# Altium footprint library con-samtec.PCBLIB: 805 footprints (part 24 of 55)
Each footprint in its own frame and in the unit in brackets; x right, y up, seen from the top. Pads: shape width x height; smd on the part's side, far side on the other; paste and mask are expansions set on the pad; w line width, h text height; cw(c..) or ccw(c..) is an arc to the next point about the centre after c.
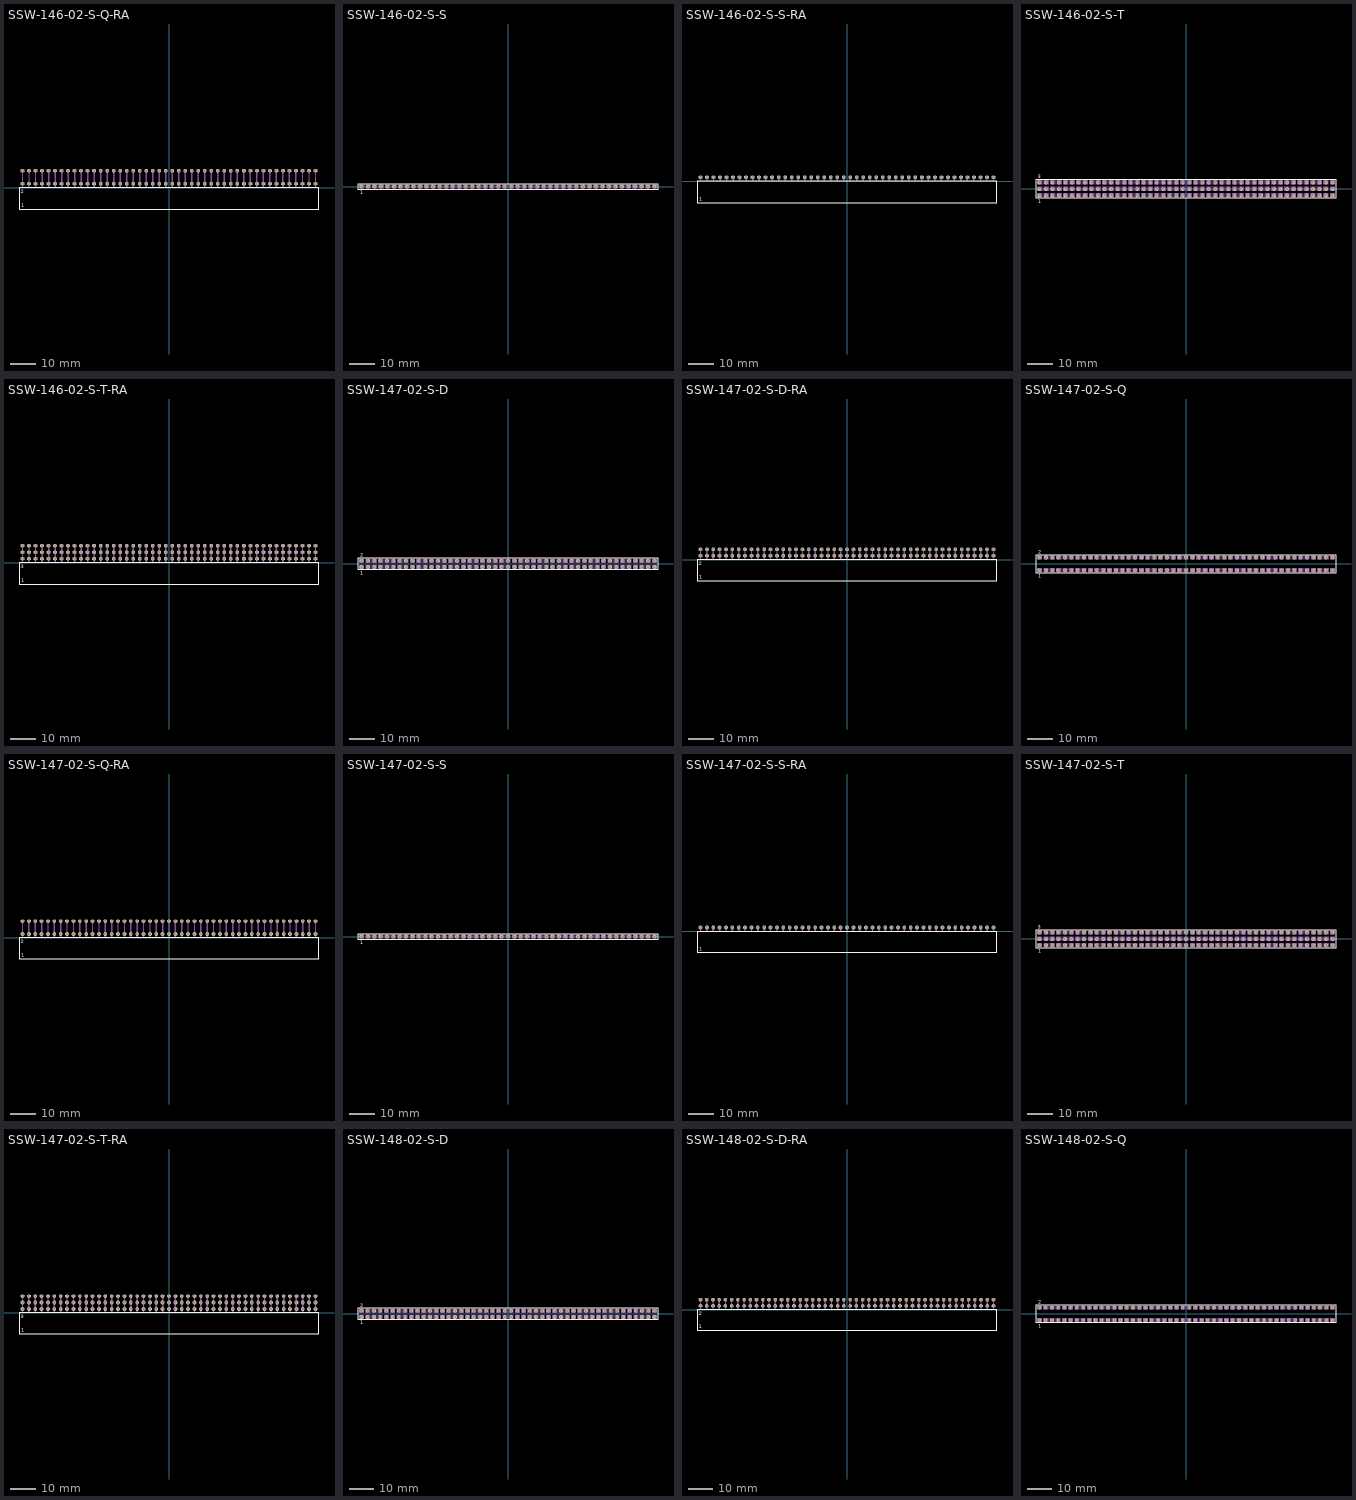
[diagram p23: the footprints below, top view; thin cyan lines are the x and y axes]

## SSW-146-02-S-Q-RA [mil]
pads (92):
  oct 59.06x59.06 hole 39.37: 1(-2250,60) 2(-2250,260) 3(-2150,60) 4(-2150,260) 5(-2050,60) 6(-2050,260) 7(-1950,60) 8(-1950,260) 9(-1850,60) 10(-1850,260) 11(-1750,60) 12(-1750,260) 13(-1650,60) 14(-1650,260) 15(-1550,60) 16(-1550,260) 17(-1450,60) 18(-1450,260) 19(-1350,60) 20(-1350,260) 21(-1250,60) 22(-1250,260) 23(-1150,60) 24(-1150,260) 25(-1050,60) 26(-1050,260) 27(-950,60) 28(-950,260) 29(-850,60) 30(-850,260) 31(-750,60) 32(-750,260) 33(-650,60) 34(-650,260) 35(-550,60) 36(-550,260) 37(-450,60) 38(-450,260) 39(-350,60) 40(-350,260) 41(-250,60) 42(-250,260) 43(-150,60) 44(-150,260) 45(-50,60) 46(-50,260) 47(50,60) 48(50,260) 49(150,60) 50(150,260) 51(250,60) 52(250,260) 53(350,60) 54(350,260) 55(450,60) 56(450,260) 57(550,60) 58(550,260) 59(650,60) 60(650,260) 61(750,60) 62(750,260) 63(850,60) 64(850,260) 65(950,60) 66(950,260) 67(1050,60) 68(1050,260) 69(1150,60) 70(1150,260) 71(1250,60) 72(1250,260) 73(1350,60) 74(1350,260) 75(1450,60) 76(1450,260) 77(1550,60) 78(1550,260) 79(1650,60) 80(1650,260) 81(1750,60) 82(1750,260) 83(1850,60) 84(1850,260) 85(1950,60) 86(1950,260) 87(2050,60) 88(2050,260) 89(2150,60) 90(2150,260) 91(2250,60) 92(2250,260)
Top Overlay:
  lines w8: -2305.08,-330.55 2305.08,-330.55 2305.08,-4.17 -2305.08,-4.17 -2305.08,-330.55
  text "1" at -2273.43,-301.18 h56.1
  text "2" at -2276.38,-86.61 h56.1
Mechanical 16:
  rectangle: -2260,0 -2240,270
  rectangle: -2160,0 -2140,270
  rectangle: -2060,0 -2040,270
  rectangle: -1960,0 -1940,270
  rectangle: -1860,0 -1840,270
  rectangle: -1760,0 -1740,270
  rectangle: -1660,0 -1640,270
  rectangle: -1560,0 -1540,270
  rectangle: -1460,0 -1440,270
  rectangle: -1360,0 -1340,270
  rectangle: -1260,0 -1240,270
  rectangle: -1160,0 -1140,270
  rectangle: -1060,0 -1040,270
  rectangle: -960,0 -940,270
  rectangle: -860,0 -840,270
  rectangle: -760,0 -740,270
  rectangle: -660,0 -640,270
  rectangle: -560,0 -540,270
  rectangle: -460,0 -440,270
  rectangle: -360,0 -340,270
  rectangle: -260,0 -240,270
  rectangle: -160,0 -140,270
  rectangle: -60,0 -40,270
  rectangle: 40,0 60,270
  rectangle: 140,0 160,270
  rectangle: 240,0 260,270
  rectangle: 340,0 360,270
  rectangle: 440,0 460,270
  rectangle: 540,0 560,270
  rectangle: 640,0 660,270
  rectangle: 740,0 760,270
  rectangle: 840,0 860,270
  rectangle: 940,0 960,270
  rectangle: 1040,0 1060,270
  rectangle: 1140,0 1160,270
  rectangle: 1240,0 1260,270
  rectangle: 1340,0 1360,270
  rectangle: 1440,0 1460,270
  rectangle: 1540,0 1560,270
  rectangle: 1640,0 1660,270
  rectangle: 1740,0 1760,270
  rectangle: 1840,0 1860,270
  rectangle: 1940,0 1960,270
  rectangle: 2040,0 2060,270
  rectangle: 2140,0 2160,270
  rectangle: 2240,0 2260,270

## SSW-146-02-S-S [mm]
pads (46):
  oct 1.5x1.5 hole 1: 1(-57.15,0) 2(-54.61,0) 3(-52.07,0) 4(-49.53,0) 5(-46.99,0) 6(-44.45,0) 7(-41.91,0) 8(-39.37,0) 9(-36.83,0) 10(-34.29,0) 11(-31.75,0) 12(-29.21,0) 13(-26.67,0) 14(-24.13,0) 15(-21.59,0) 16(-19.05,0) 17(-16.51,0) 18(-13.97,0) 19(-11.43,0) 20(-8.89,0) 21(-6.35,0) 22(-3.81,0) 23(-1.27,0) 24(1.27,0) 25(3.81,0) 26(6.35,0) 27(8.89,0) 28(11.43,0) 29(13.97,0) 30(16.51,0) 31(19.05,0) 32(21.59,0) 33(24.13,0) 34(26.67,0) 35(29.21,0) 36(31.75,0) 37(34.29,0) 38(36.83,0) 39(39.37,0) 40(41.91,0) 41(44.45,0) 42(46.99,0) 43(49.53,0) 44(52.07,0) 45(54.61,0) 46(57.15,0)
Top Overlay:
  lines w0.203: -58.549,-1.155 58.549,-1.155 58.549,1.155 -58.549,1.155 -58.549,-1.155
  text "1" at -57.658,-3.048 h1.42
Mechanical 16:
  drawing of 184 lines, arcs and shapes, not listed

## SSW-146-02-S-S-RA [mil]
pads (46):
  oct 59.06x59.06 hole 39.37: 1(-2250,60) 2(-2150,60) 3(-2050,60) 4(-1950,60) 5(-1850,60) 6(-1750,60) 7(-1650,60) 8(-1550,60) 9(-1450,60) 10(-1350,60) 11(-1250,60) 12(-1150,60) 13(-1050,60) 14(-950,60) 15(-850,60) 16(-750,60) 17(-650,60) 18(-550,60) 19(-450,60) 20(-350,60) 21(-250,60) 22(-150,60) 23(-50,60) 24(50,60) 25(150,60) 26(250,60) 27(350,60) 28(450,60) 29(550,60) 30(650,60) 31(750,60) 32(850,60) 33(950,60) 34(1050,60) 35(1150,60) 36(1250,60) 37(1350,60) 38(1450,60) 39(1550,60) 40(1650,60) 41(1750,60) 42(1850,60) 43(1950,60) 44(2050,60) 45(2150,60) 46(2250,60)
Top Overlay:
  lines w8: -2305.08,-330.55 2305.08,-330.55 2305.08,-4.17 -2305.08,-4.17 -2305.08,-330.55
  text "1" at -2273.43,-301.18 h56.1
Mechanical 16:
  rectangle: -2260,0 -2240,70
  rectangle: -2160,0 -2140,70
  rectangle: -2060,0 -2040,70
  rectangle: -1960,0 -1940,70
  rectangle: -1860,0 -1840,70
  rectangle: -1760,0 -1740,70
  rectangle: -1660,0 -1640,70
  rectangle: -1560,0 -1540,70
  rectangle: -1460,0 -1440,70
  rectangle: -1360,0 -1340,70
  rectangle: -1260,0 -1240,70
  rectangle: -1160,0 -1140,70
  rectangle: -1060,0 -1040,70
  rectangle: -960,0 -940,70
  rectangle: -860,0 -840,70
  rectangle: -760,0 -740,70
  rectangle: -660,0 -640,70
  rectangle: -560,0 -540,70
  rectangle: -460,0 -440,70
  rectangle: -360,0 -340,70
  rectangle: -260,0 -240,70
  rectangle: -160,0 -140,70
  rectangle: -60,0 -40,70
  rectangle: 40,0 60,70
  rectangle: 140,0 160,70
  rectangle: 240,0 260,70
  rectangle: 340,0 360,70
  rectangle: 440,0 460,70
  rectangle: 540,0 560,70
  rectangle: 640,0 660,70
  rectangle: 740,0 760,70
  rectangle: 840,0 860,70
  rectangle: 940,0 960,70
  rectangle: 1040,0 1060,70
  rectangle: 1140,0 1160,70
  rectangle: 1240,0 1260,70
  rectangle: 1340,0 1360,70
  rectangle: 1440,0 1460,70
  rectangle: 1540,0 1560,70
  rectangle: 1640,0 1660,70
  rectangle: 1740,0 1760,70
  rectangle: 1840,0 1860,70
  rectangle: 1940,0 1960,70
  rectangle: 2040,0 2060,70
  rectangle: 2140,0 2160,70
  rectangle: 2240,0 2260,70

## SSW-146-02-S-T [mm]
pads (138):
  oct 1.5x1.5 hole 1: 1(-57.15,-2.54) 2(-57.15,0) 3(-57.15,2.54) 4(-54.61,-2.54) 5(-54.61,0) 6(-54.61,2.54) 7(-52.07,-2.54) 8(-52.07,0) 9(-52.07,2.54) 10(-49.53,-2.54) 11(-49.53,0) 12(-49.53,2.54) 13(-46.99,-2.54) 14(-46.99,0) 15(-46.99,2.54) 16(-44.45,-2.54) 17(-44.45,0) 18(-44.45,2.54) 19(-41.91,-2.54) 20(-41.91,0) 21(-41.91,2.54) 22(-39.37,-2.54) 23(-39.37,0) 24(-39.37,2.54) 25(-36.83,-2.54) 26(-36.83,0) 27(-36.83,2.54) 28(-34.29,-2.54) 29(-34.29,0) 30(-34.29,2.54) 31(-31.75,-2.54) 32(-31.75,0) 33(-31.75,2.54) 34(-29.21,-2.54) 35(-29.21,0) 36(-29.21,2.54) 37(-26.67,-2.54) 38(-26.67,0) 39(-26.67,2.54) 40(-24.13,-2.54) 41(-24.13,0) 42(-24.13,2.54) 43(-21.59,-2.54) 44(-21.59,0) 45(-21.59,2.54) 46(-19.05,-2.54) 47(-19.05,0) 48(-19.05,2.54) 49(-16.51,-2.54) 50(-16.51,0) 51(-16.51,2.54) 52(-13.97,-2.54) 53(-13.97,0) 54(-13.97,2.54) 55(-11.43,-2.54) 56(-11.43,0) 57(-11.43,2.54) 58(-8.89,-2.54) 59(-8.89,0) 60(-8.89,2.54) 61(-6.35,-2.54) 62(-6.35,0) 63(-6.35,2.54) 64(-3.81,-2.54) 65(-3.81,0) 66(-3.81,2.54) 67(-1.27,-2.54) 68(-1.27,0) 69(-1.27,2.54) 70(1.27,-2.54) 71(1.27,0) 72(1.27,2.54) 73(3.81,-2.54) 74(3.81,0) 75(3.81,2.54) 76(6.35,-2.54) 77(6.35,0) 78(6.35,2.54) 79(8.89,-2.54) 80(8.89,0) 81(8.89,2.54) 82(11.43,-2.54) 83(11.43,0) 84(11.43,2.54) 85(13.97,-2.54) 86(13.97,0) 87(13.97,2.54) 88(16.51,-2.54) 89(16.51,0) 90(16.51,2.54) 91(19.05,-2.54) 92(19.05,0) 93(19.05,2.54) 94(21.59,-2.54) 95(21.59,0) 96(21.59,2.54) 97(24.13,-2.54) 98(24.13,0) 99(24.13,2.54) 100(26.67,-2.54) 101(26.67,0) 102(26.67,2.54) 103(29.21,-2.54) 104(29.21,0) 105(29.21,2.54) 106(31.75,-2.54) 107(31.75,0) 108(31.75,2.54) 109(34.29,-2.54) 110(34.29,0) 111(34.29,2.54) 112(36.83,-2.54) 113(36.83,0) 114(36.83,2.54) 115(39.37,-2.54) 116(39.37,0) 117(39.37,2.54) 118(41.91,-2.54) 119(41.91,0) 120(41.91,2.54) 121(44.45,-2.54) 122(44.45,0) 123(44.45,2.54) 124(46.99,-2.54) 125(46.99,0) 126(46.99,2.54) 127(49.53,-2.54) 128(49.53,0) 129(49.53,2.54) 130(52.07,-2.54) 131(52.07,0) 132(52.07,2.54) 133(54.61,-2.54) 134(54.61,0) 135(54.61,2.54) 136(57.15,-2.54) 137(57.15,0) 138(57.15,2.54)
Top Overlay:
  lines w0.203: -58.549,-3.695 58.549,-3.695 58.549,3.695 -58.549,3.695 -58.549,-3.695
  text "1" at -57.658,-5.588 h1.42
  text "3" at -57.912,4.064 h1.42
Mechanical 16:
  drawing of 552 lines, arcs and shapes, not listed

## SSW-146-02-S-T-RA [mil]
pads (138):
  oct 59.06x59.06 hole 39.37: 1(-2250,60) 2(-2250,160) 3(-2250,260) 4(-2150,60) 5(-2150,160) 6(-2150,260) 7(-2050,60) 8(-2050,160) 9(-2050,260) 10(-1950,60) 11(-1950,160) 12(-1950,260) 13(-1850,60) 14(-1850,160) 15(-1850,260) 16(-1750,60) 17(-1750,160) 18(-1750,260) 19(-1650,60) 20(-1650,160) 21(-1650,260) 22(-1550,60) 23(-1550,160) 24(-1550,260) 25(-1450,60) 26(-1450,160) 27(-1450,260) 28(-1350,60) 29(-1350,160) 30(-1350,260) 31(-1250,60) 32(-1250,160) 33(-1250,260) 34(-1150,60) 35(-1150,160) 36(-1150,260) 37(-1050,60) 38(-1050,160) 39(-1050,260) 40(-950,60) 41(-950,160) 42(-950,260) 43(-850,60) 44(-850,160) 45(-850,260) 46(-750,60) 47(-750,160) 48(-750,260) 49(-650,60) 50(-650,160) 51(-650,260) 52(-550,60) 53(-550,160) 54(-550,260) 55(-450,60) 56(-450,160) 57(-450,260) 58(-350,60) 59(-350,160) 60(-350,260) 61(-250,60) 62(-250,160) 63(-250,260) 64(-150,60) 65(-150,160) 66(-150,260) 67(-50,60) 68(-50,160) 69(-50,260) 70(50,60) 71(50,160) 72(50,260) 73(150,60) 74(150,160) 75(150,260) 76(250,60) 77(250,160) 78(250,260) 79(350,60) 80(350,160) 81(350,260) 82(450,60) 83(450,160) 84(450,260) 85(550,60) 86(550,160) 87(550,260) 88(650,60) 89(650,160) 90(650,260) 91(750,60) 92(750,160) 93(750,260) 94(850,60) 95(850,160) 96(850,260) 97(950,60) 98(950,160) 99(950,260) 100(1050,60) 101(1050,160) 102(1050,260) 103(1150,60) 104(1150,160) 105(1150,260) 106(1250,60) 107(1250,160) 108(1250,260) 109(1350,60) 110(1350,160) 111(1350,260) 112(1450,60) 113(1450,160) 114(1450,260) 115(1550,60) 116(1550,160) 117(1550,260) 118(1650,60) 119(1650,160) 120(1650,260) 121(1750,60) 122(1750,160) 123(1750,260) 124(1850,60) 125(1850,160) 126(1850,260) 127(1950,60) 128(1950,160) 129(1950,260) 130(2050,60) 131(2050,160) 132(2050,260) 133(2150,60) 134(2150,160) 135(2150,260) 136(2250,60) 137(2250,160) 138(2250,260)
Top Overlay:
  lines w8: -2305.08,-330.55 2305.08,-330.55 2305.08,-4.17 -2305.08,-4.17 -2305.08,-330.55
  text "1" at -2273.43,-301.18 h56.1
  text "3" at -2276.38,-86.61 h56.1
Mechanical 16:
  rectangle: -2260,0 -2240,270
  rectangle: -2160,0 -2140,270
  rectangle: -2060,0 -2040,270
  rectangle: -1960,0 -1940,270
  rectangle: -1860,0 -1840,270
  rectangle: -1760,0 -1740,270
  rectangle: -1660,0 -1640,270
  rectangle: -1560,0 -1540,270
  rectangle: -1460,0 -1440,270
  rectangle: -1360,0 -1340,270
  rectangle: -1260,0 -1240,270
  rectangle: -1160,0 -1140,270
  rectangle: -1060,0 -1040,270
  rectangle: -960,0 -940,270
  rectangle: -860,0 -840,270
  rectangle: -760,0 -740,270
  rectangle: -660,0 -640,270
  rectangle: -560,0 -540,270
  rectangle: -460,0 -440,270
  rectangle: -360,0 -340,270
  rectangle: -260,0 -240,270
  rectangle: -160,0 -140,270
  rectangle: -60,0 -40,270
  rectangle: 40,0 60,270
  rectangle: 140,0 160,270
  rectangle: 240,0 260,270
  rectangle: 340,0 360,270
  rectangle: 440,0 460,270
  rectangle: 540,0 560,270
  rectangle: 640,0 660,270
  rectangle: 740,0 760,270
  rectangle: 840,0 860,270
  rectangle: 940,0 960,270
  rectangle: 1040,0 1060,270
  rectangle: 1140,0 1160,270
  rectangle: 1240,0 1260,270
  rectangle: 1340,0 1360,270
  rectangle: 1440,0 1460,270
  rectangle: 1540,0 1560,270
  rectangle: 1640,0 1660,270
  rectangle: 1740,0 1760,270
  rectangle: 1840,0 1860,270
  rectangle: 1940,0 1960,270
  rectangle: 2040,0 2060,270
  rectangle: 2140,0 2160,270
  rectangle: 2240,0 2260,270

## SSW-147-02-S-D [mm]
pads (94):
  oct 1.5x1.5 hole 1: 1(-58.42,-1.27) 2(-58.42,1.27) 3(-55.88,-1.27) 4(-55.88,1.27) 5(-53.34,-1.27) 6(-53.34,1.27) 7(-50.8,-1.27) 8(-50.8,1.27) 9(-48.26,-1.27) 10(-48.26,1.27) 11(-45.72,-1.27) 12(-45.72,1.27) 13(-43.18,-1.27) 14(-43.18,1.27) 15(-40.64,-1.27) 16(-40.64,1.27) 17(-38.1,-1.27) 18(-38.1,1.27) 19(-35.56,-1.27) 20(-35.56,1.27) 21(-33.02,-1.27) 22(-33.02,1.27) 23(-30.48,-1.27) 24(-30.48,1.27) 25(-27.94,-1.27) 26(-27.94,1.27) 27(-25.4,-1.27) 28(-25.4,1.27) 29(-22.86,-1.27) 30(-22.86,1.27) 31(-20.32,-1.27) 32(-20.32,1.27) 33(-17.78,-1.27) 34(-17.78,1.27) 35(-15.24,-1.27) 36(-15.24,1.27) 37(-12.7,-1.27) 38(-12.7,1.27) 39(-10.16,-1.27) 40(-10.16,1.27) 41(-7.62,-1.27) 42(-7.62,1.27) 43(-5.08,-1.27) 44(-5.08,1.27) 45(-2.54,-1.27) 46(-2.54,1.27) 47(0,-1.27) 48(0,1.27) 49(2.54,-1.27) 50(2.54,1.27) 51(5.08,-1.27) 52(5.08,1.27) 53(7.62,-1.27) 54(7.62,1.27) 55(10.16,-1.27) 56(10.16,1.27) 57(12.7,-1.27) 58(12.7,1.27) 59(15.24,-1.27) 60(15.24,1.27) 61(17.78,-1.27) 62(17.78,1.27) 63(20.32,-1.27) 64(20.32,1.27) 65(22.86,-1.27) 66(22.86,1.27) 67(25.4,-1.27) 68(25.4,1.27) 69(27.94,-1.27) 70(27.94,1.27) 71(30.48,-1.27) 72(30.48,1.27) 73(33.02,-1.27) 74(33.02,1.27) 75(35.56,-1.27) 76(35.56,1.27) 77(38.1,-1.27) 78(38.1,1.27) 79(40.64,-1.27) 80(40.64,1.27) 81(43.18,-1.27) 82(43.18,1.27) 83(45.72,-1.27) 84(45.72,1.27) 85(48.26,-1.27) 86(48.26,1.27) 87(50.8,-1.27) 88(50.8,1.27) 89(53.34,-1.27) 90(53.34,1.27) 91(55.88,-1.27) 92(55.88,1.27) 93(58.42,-1.27) 94(58.42,1.27)
Top Overlay:
  lines w0.203: -59.819,-2.425 59.819,-2.425 59.819,2.425 -59.819,2.425 -59.819,-2.425
  text "1" at -58.928,-4.318 h1.42
  text "2" at -58.928,2.794 h1.42
Mechanical 16:
  drawing of 376 lines, arcs and shapes, not listed

## SSW-147-02-S-D-RA [mil]
pads (94):
  oct 59.06x59.06 hole 39.37: 1(-2300,60) 2(-2300,160) 3(-2200,60) 4(-2200,160) 5(-2100,60) 6(-2100,160) 7(-2000,60) 8(-2000,160) 9(-1900,60) 10(-1900,160) 11(-1800,60) 12(-1800,160) 13(-1700,60) 14(-1700,160) 15(-1600,60) 16(-1600,160) 17(-1500,60) 18(-1500,160) 19(-1400,60) 20(-1400,160) 21(-1300,60) 22(-1300,160) 23(-1200,60) 24(-1200,160) 25(-1100,60) 26(-1100,160) 27(-1000,60) 28(-1000,160) 29(-900,60) 30(-900,160) 31(-800,60) 32(-800,160) 33(-700,60) 34(-700,160) 35(-600,60) 36(-600,160) 37(-500,60) 38(-500,160) 39(-400,60) 40(-400,160) 41(-300,60) 42(-300,160) 43(-200,60) 44(-200,160) 45(-100,60) 46(-100,160) 47(0,60) 48(0,160) 49(100,60) 50(100,160) 51(200,60) 52(200,160) 53(300,60) 54(300,160) 55(400,60) 56(400,160) 57(500,60) 58(500,160) 59(600,60) 60(600,160) 61(700,60) 62(700,160) 63(800,60) 64(800,160) 65(900,60) 66(900,160) 67(1000,60) 68(1000,160) 69(1100,60) 70(1100,160) 71(1200,60) 72(1200,160) 73(1300,60) 74(1300,160) 75(1400,60) 76(1400,160) 77(1500,60) 78(1500,160) 79(1600,60) 80(1600,160) 81(1700,60) 82(1700,160) 83(1800,60) 84(1800,160) 85(1900,60) 86(1900,160) 87(2000,60) 88(2000,160) 89(2100,60) 90(2100,160) 91(2200,60) 92(2200,160) 93(2300,60) 94(2300,160)
Top Overlay:
  lines w8: -2355.08,-330.55 2355.08,-330.55 2355.08,-4.17 -2355.08,-4.17 -2355.08,-330.55
  text "1" at -2323.43,-301.18 h56.1
  text "2" at -2326.38,-86.61 h56.1
Mechanical 16:
  rectangle: -2310,0 -2290,170
  rectangle: -2210,0 -2190,170
  rectangle: -2110,0 -2090,170
  rectangle: -2010,0 -1990,170
  rectangle: -1910,0 -1890,170
  rectangle: -1810,0 -1790,170
  rectangle: -1710,0 -1690,170
  rectangle: -1610,0 -1590,170
  rectangle: -1510,0 -1490,170
  rectangle: -1410,0 -1390,170
  rectangle: -1310,0 -1290,170
  rectangle: -1210,0 -1190,170
  rectangle: -1110,0 -1090,170
  rectangle: -1010,0 -990,170
  rectangle: -910,0 -890,170
  rectangle: -810,0 -790,170
  rectangle: -710,0 -690,170
  rectangle: -610,0 -590,170
  rectangle: -510,0 -490,170
  rectangle: -410,0 -390,170
  rectangle: -310,0 -290,170
  rectangle: -210,0 -190,170
  rectangle: -110,0 -90,170
  rectangle: -10,0 10,170
  rectangle: 90,0 110,170
  rectangle: 190,0 210,170
  rectangle: 290,0 310,170
  rectangle: 390,0 410,170
  rectangle: 490,0 510,170
  rectangle: 590,0 610,170
  rectangle: 690,0 710,170
  rectangle: 790,0 810,170
  rectangle: 890,0 910,170
  rectangle: 990,0 1010,170
  rectangle: 1090,0 1110,170
  rectangle: 1190,0 1210,170
  rectangle: 1290,0 1310,170
  rectangle: 1390,0 1410,170
  rectangle: 1490,0 1510,170
  rectangle: 1590,0 1610,170
  rectangle: 1690,0 1710,170
  rectangle: 1790,0 1810,170
  rectangle: 1890,0 1910,170
  rectangle: 1990,0 2010,170
  rectangle: 2090,0 2110,170
  rectangle: 2190,0 2210,170
  rectangle: 2290,0 2310,170

## SSW-147-02-S-Q [mm]
pads (94):
  oct 1.5x1.5 hole 1: 1(-58.42,-2.54) 2(-58.42,2.54) 3(-55.88,-2.54) 4(-55.88,2.54) 5(-53.34,-2.54) 6(-53.34,2.54) 7(-50.8,-2.54) 8(-50.8,2.54) 9(-48.26,-2.54) 10(-48.26,2.54) 11(-45.72,-2.54) 12(-45.72,2.54) 13(-43.18,-2.54) 14(-43.18,2.54) 15(-40.64,-2.54) 16(-40.64,2.54) 17(-38.1,-2.54) 18(-38.1,2.54) 19(-35.56,-2.54) 20(-35.56,2.54) 21(-33.02,-2.54) 22(-33.02,2.54) 23(-30.48,-2.54) 24(-30.48,2.54) 25(-27.94,-2.54) 26(-27.94,2.54) 27(-25.4,-2.54) 28(-25.4,2.54) 29(-22.86,-2.54) 30(-22.86,2.54) 31(-20.32,-2.54) 32(-20.32,2.54) 33(-17.78,-2.54) 34(-17.78,2.54) 35(-15.24,-2.54) 36(-15.24,2.54) 37(-12.7,-2.54) 38(-12.7,2.54) 39(-10.16,-2.54) 40(-10.16,2.54) 41(-7.62,-2.54) 42(-7.62,2.54) 43(-5.08,-2.54) 44(-5.08,2.54) 45(-2.54,-2.54) 46(-2.54,2.54) 47(0,-2.54) 48(0,2.54) 49(2.54,-2.54) 50(2.54,2.54) 51(5.08,-2.54) 52(5.08,2.54) 53(7.62,-2.54) 54(7.62,2.54) 55(10.16,-2.54) 56(10.16,2.54) 57(12.7,-2.54) 58(12.7,2.54) 59(15.24,-2.54) 60(15.24,2.54) 61(17.78,-2.54) 62(17.78,2.54) 63(20.32,-2.54) 64(20.32,2.54) 65(22.86,-2.54) 66(22.86,2.54) 67(25.4,-2.54) 68(25.4,2.54) 69(27.94,-2.54) 70(27.94,2.54) 71(30.48,-2.54) 72(30.48,2.54) 73(33.02,-2.54) 74(33.02,2.54) 75(35.56,-2.54) 76(35.56,2.54) 77(38.1,-2.54) 78(38.1,2.54) 79(40.64,-2.54) 80(40.64,2.54) 81(43.18,-2.54) 82(43.18,2.54) 83(45.72,-2.54) 84(45.72,2.54) 85(48.26,-2.54) 86(48.26,2.54) 87(50.8,-2.54) 88(50.8,2.54) 89(53.34,-2.54) 90(53.34,2.54) 91(55.88,-2.54) 92(55.88,2.54) 93(58.42,-2.54) 94(58.42,2.54)
Top Overlay:
  lines w0.203: -59.819,-3.695 59.819,-3.695 59.819,3.695 -59.819,3.695 -59.819,-3.695
  text "1" at -58.928,-5.588 h1.42
  text "2" at -58.928,4.064 h1.42
Mechanical 16:
  drawing of 376 lines, arcs and shapes, not listed

## SSW-147-02-S-Q-RA [mil]
pads (94):
  oct 59.06x59.06 hole 39.37: 1(-2300,60) 2(-2300,260) 3(-2200,60) 4(-2200,260) 5(-2100,60) 6(-2100,260) 7(-2000,60) 8(-2000,260) 9(-1900,60) 10(-1900,260) 11(-1800,60) 12(-1800,260) 13(-1700,60) 14(-1700,260) 15(-1600,60) 16(-1600,260) 17(-1500,60) 18(-1500,260) 19(-1400,60) 20(-1400,260) 21(-1300,60) 22(-1300,260) 23(-1200,60) 24(-1200,260) 25(-1100,60) 26(-1100,260) 27(-1000,60) 28(-1000,260) 29(-900,60) 30(-900,260) 31(-800,60) 32(-800,260) 33(-700,60) 34(-700,260) 35(-600,60) 36(-600,260) 37(-500,60) 38(-500,260) 39(-400,60) 40(-400,260) 41(-300,60) 42(-300,260) 43(-200,60) 44(-200,260) 45(-100,60) 46(-100,260) 47(0,60) 48(0,260) 49(100,60) 50(100,260) 51(200,60) 52(200,260) 53(300,60) 54(300,260) 55(400,60) 56(400,260) 57(500,60) 58(500,260) 59(600,60) 60(600,260) 61(700,60) 62(700,260) 63(800,60) 64(800,260) 65(900,60) 66(900,260) 67(1000,60) 68(1000,260) 69(1100,60) 70(1100,260) 71(1200,60) 72(1200,260) 73(1300,60) 74(1300,260) 75(1400,60) 76(1400,260) 77(1500,60) 78(1500,260) 79(1600,60) 80(1600,260) 81(1700,60) 82(1700,260) 83(1800,60) 84(1800,260) 85(1900,60) 86(1900,260) 87(2000,60) 88(2000,260) 89(2100,60) 90(2100,260) 91(2200,60) 92(2200,260) 93(2300,60) 94(2300,260)
Top Overlay:
  lines w8: -2355.08,-330.55 2355.08,-330.55 2355.08,-4.17 -2355.08,-4.17 -2355.08,-330.55
  text "1" at -2323.43,-301.18 h56.1
  text "2" at -2326.38,-86.61 h56.1
Mechanical 16:
  rectangle: -2310,0 -2290,270
  rectangle: -2210,0 -2190,270
  rectangle: -2110,0 -2090,270
  rectangle: -2010,0 -1990,270
  rectangle: -1910,0 -1890,270
  rectangle: -1810,0 -1790,270
  rectangle: -1710,0 -1690,270
  rectangle: -1610,0 -1590,270
  rectangle: -1510,0 -1490,270
  rectangle: -1410,0 -1390,270
  rectangle: -1310,0 -1290,270
  rectangle: -1210,0 -1190,270
  rectangle: -1110,0 -1090,270
  rectangle: -1010,0 -990,270
  rectangle: -910,0 -890,270
  rectangle: -810,0 -790,270
  rectangle: -710,0 -690,270
  rectangle: -610,0 -590,270
  rectangle: -510,0 -490,270
  rectangle: -410,0 -390,270
  rectangle: -310,0 -290,270
  rectangle: -210,0 -190,270
  rectangle: -110,0 -90,270
  rectangle: -10,0 10,270
  rectangle: 90,0 110,270
  rectangle: 190,0 210,270
  rectangle: 290,0 310,270
  rectangle: 390,0 410,270
  rectangle: 490,0 510,270
  rectangle: 590,0 610,270
  rectangle: 690,0 710,270
  rectangle: 790,0 810,270
  rectangle: 890,0 910,270
  rectangle: 990,0 1010,270
  rectangle: 1090,0 1110,270
  rectangle: 1190,0 1210,270
  rectangle: 1290,0 1310,270
  rectangle: 1390,0 1410,270
  rectangle: 1490,0 1510,270
  rectangle: 1590,0 1610,270
  rectangle: 1690,0 1710,270
  rectangle: 1790,0 1810,270
  rectangle: 1890,0 1910,270
  rectangle: 1990,0 2010,270
  rectangle: 2090,0 2110,270
  rectangle: 2190,0 2210,270
  rectangle: 2290,0 2310,270

## SSW-147-02-S-S [mm]
pads (47):
  oct 1.5x1.5 hole 1: 1(-58.42,0) 2(-55.88,0) 3(-53.34,0) 4(-50.8,0) 5(-48.26,0) 6(-45.72,0) 7(-43.18,0) 8(-40.64,0) 9(-38.1,0) 10(-35.56,0) 11(-33.02,0) 12(-30.48,0) 13(-27.94,0) 14(-25.4,0) 15(-22.86,0) 16(-20.32,0) 17(-17.78,0) 18(-15.24,0) 19(-12.7,0) 20(-10.16,0) 21(-7.62,0) 22(-5.08,0) 23(-2.54,0) 24(0,0) 25(2.54,0) 26(5.08,0) 27(7.62,0) 28(10.16,0) 29(12.7,0) 30(15.24,0) 31(17.78,0) 32(20.32,0) 33(22.86,0) 34(25.4,0) 35(27.94,0) 36(30.48,0) 37(33.02,0) 38(35.56,0) 39(38.1,0) 40(40.64,0) 41(43.18,0) 42(45.72,0) 43(48.26,0) 44(50.8,0) 45(53.34,0) 46(55.88,0) 47(58.42,0)
Top Overlay:
  lines w0.203: -59.819,-1.155 59.819,-1.155 59.819,1.155 -59.819,1.155 -59.819,-1.155
  text "1" at -58.928,-3.048 h1.42
Mechanical 16:
  drawing of 188 lines, arcs and shapes, not listed

## SSW-147-02-S-S-RA [mil]
pads (47):
  oct 59.06x59.06 hole 39.37: 1(-2300,60) 2(-2200,60) 3(-2100,60) 4(-2000,60) 5(-1900,60) 6(-1800,60) 7(-1700,60) 8(-1600,60) 9(-1500,60) 10(-1400,60) 11(-1300,60) 12(-1200,60) 13(-1100,60) 14(-1000,60) 15(-900,60) 16(-800,60) 17(-700,60) 18(-600,60) 19(-500,60) 20(-400,60) 21(-300,60) 22(-200,60) 23(-100,60) 24(0,60) 25(100,60) 26(200,60) 27(300,60) 28(400,60) 29(500,60) 30(600,60) 31(700,60) 32(800,60) 33(900,60) 34(1000,60) 35(1100,60) 36(1200,60) 37(1300,60) 38(1400,60) 39(1500,60) 40(1600,60) 41(1700,60) 42(1800,60) 43(1900,60) 44(2000,60) 45(2100,60) 46(2200,60) 47(2300,60)
Top Overlay:
  lines w8: -2355.08,-330.55 2355.08,-330.55 2355.08,-4.17 -2355.08,-4.17 -2355.08,-330.55
  text "1" at -2323.43,-301.18 h56.1
Mechanical 16:
  rectangle: -2310,0 -2290,70
  rectangle: -2210,0 -2190,70
  rectangle: -2110,0 -2090,70
  rectangle: -2010,0 -1990,70
  rectangle: -1910,0 -1890,70
  rectangle: -1810,0 -1790,70
  rectangle: -1710,0 -1690,70
  rectangle: -1610,0 -1590,70
  rectangle: -1510,0 -1490,70
  rectangle: -1410,0 -1390,70
  rectangle: -1310,0 -1290,70
  rectangle: -1210,0 -1190,70
  rectangle: -1110,0 -1090,70
  rectangle: -1010,0 -990,70
  rectangle: -910,0 -890,70
  rectangle: -810,0 -790,70
  rectangle: -710,0 -690,70
  rectangle: -610,0 -590,70
  rectangle: -510,0 -490,70
  rectangle: -410,0 -390,70
  rectangle: -310,0 -290,70
  rectangle: -210,0 -190,70
  rectangle: -110,0 -90,70
  rectangle: -10,0 10,70
  rectangle: 90,0 110,70
  rectangle: 190,0 210,70
  rectangle: 290,0 310,70
  rectangle: 390,0 410,70
  rectangle: 490,0 510,70
  rectangle: 590,0 610,70
  rectangle: 690,0 710,70
  rectangle: 790,0 810,70
  rectangle: 890,0 910,70
  rectangle: 990,0 1010,70
  rectangle: 1090,0 1110,70
  rectangle: 1190,0 1210,70
  rectangle: 1290,0 1310,70
  rectangle: 1390,0 1410,70
  rectangle: 1490,0 1510,70
  rectangle: 1590,0 1610,70
  rectangle: 1690,0 1710,70
  rectangle: 1790,0 1810,70
  rectangle: 1890,0 1910,70
  rectangle: 1990,0 2010,70
  rectangle: 2090,0 2110,70
  rectangle: 2190,0 2210,70
  rectangle: 2290,0 2310,70

## SSW-147-02-S-T [mm]
pads (141):
  oct 1.5x1.5 hole 1: 1(-58.42,-2.54) 2(-58.42,0) 3(-58.42,2.54) 4(-55.88,-2.54) 5(-55.88,0) 6(-55.88,2.54) 7(-53.34,-2.54) 8(-53.34,0) 9(-53.34,2.54) 10(-50.8,-2.54) 11(-50.8,0) 12(-50.8,2.54) 13(-48.26,-2.54) 14(-48.26,0) 15(-48.26,2.54) 16(-45.72,-2.54) 17(-45.72,0) 18(-45.72,2.54) 19(-43.18,-2.54) 20(-43.18,0) 21(-43.18,2.54) 22(-40.64,-2.54) 23(-40.64,0) 24(-40.64,2.54) 25(-38.1,-2.54) 26(-38.1,0) 27(-38.1,2.54) 28(-35.56,-2.54) 29(-35.56,0) 30(-35.56,2.54) 31(-33.02,-2.54) 32(-33.02,0) 33(-33.02,2.54) 34(-30.48,-2.54) 35(-30.48,0) 36(-30.48,2.54) 37(-27.94,-2.54) 38(-27.94,0) 39(-27.94,2.54) 40(-25.4,-2.54) 41(-25.4,0) 42(-25.4,2.54) 43(-22.86,-2.54) 44(-22.86,0) 45(-22.86,2.54) 46(-20.32,-2.54) 47(-20.32,0) 48(-20.32,2.54) 49(-17.78,-2.54) 50(-17.78,0) 51(-17.78,2.54) 52(-15.24,-2.54) 53(-15.24,0) 54(-15.24,2.54) 55(-12.7,-2.54) 56(-12.7,0) 57(-12.7,2.54) 58(-10.16,-2.54) 59(-10.16,0) 60(-10.16,2.54) 61(-7.62,-2.54) 62(-7.62,0) 63(-7.62,2.54) 64(-5.08,-2.54) 65(-5.08,0) 66(-5.08,2.54) 67(-2.54,-2.54) 68(-2.54,0) 69(-2.54,2.54) 70(0,-2.54) 71(0,0) 72(0,2.54) 73(2.54,-2.54) 74(2.54,0) 75(2.54,2.54) 76(5.08,-2.54) 77(5.08,0) 78(5.08,2.54) 79(7.62,-2.54) 80(7.62,0) 81(7.62,2.54) 82(10.16,-2.54) 83(10.16,0) 84(10.16,2.54) 85(12.7,-2.54) 86(12.7,0) 87(12.7,2.54) 88(15.24,-2.54) 89(15.24,0) 90(15.24,2.54) 91(17.78,-2.54) 92(17.78,0) 93(17.78,2.54) 94(20.32,-2.54) 95(20.32,0) 96(20.32,2.54) 97(22.86,-2.54) 98(22.86,0) 99(22.86,2.54) 100(25.4,-2.54) 101(25.4,0) 102(25.4,2.54) 103(27.94,-2.54) 104(27.94,0) 105(27.94,2.54) 106(30.48,-2.54) 107(30.48,0) 108(30.48,2.54) 109(33.02,-2.54) 110(33.02,0) 111(33.02,2.54) 112(35.56,-2.54) 113(35.56,0) 114(35.56,2.54) 115(38.1,-2.54) 116(38.1,0) 117(38.1,2.54) 118(40.64,-2.54) 119(40.64,0) 120(40.64,2.54) 121(43.18,-2.54) 122(43.18,0) 123(43.18,2.54) 124(45.72,-2.54) 125(45.72,0) 126(45.72,2.54) 127(48.26,-2.54) 128(48.26,0) 129(48.26,2.54) 130(50.8,-2.54) 131(50.8,0) 132(50.8,2.54) 133(53.34,-2.54) 134(53.34,0) 135(53.34,2.54) 136(55.88,-2.54) 137(55.88,0) 138(55.88,2.54) 139(58.42,-2.54) 140(58.42,0) 141(58.42,2.54)
Top Overlay:
  lines w0.203: -59.819,-3.695 59.819,-3.695 59.819,3.695 -59.819,3.695 -59.819,-3.695
  text "1" at -58.928,-5.588 h1.42
  text "3" at -59.182,4.064 h1.42
Mechanical 16:
  drawing of 564 lines, arcs and shapes, not listed

## SSW-147-02-S-T-RA [mil]
pads (141):
  oct 59.06x59.06 hole 39.37: 1(-2300,60) 2(-2300,160) 3(-2300,260) 4(-2200,60) 5(-2200,160) 6(-2200,260) 7(-2100,60) 8(-2100,160) 9(-2100,260) 10(-2000,60) 11(-2000,160) 12(-2000,260) 13(-1900,60) 14(-1900,160) 15(-1900,260) 16(-1800,60) 17(-1800,160) 18(-1800,260) 19(-1700,60) 20(-1700,160) 21(-1700,260) 22(-1600,60) 23(-1600,160) 24(-1600,260) 25(-1500,60) 26(-1500,160) 27(-1500,260) 28(-1400,60) 29(-1400,160) 30(-1400,260) 31(-1300,60) 32(-1300,160) 33(-1300,260) 34(-1200,60) 35(-1200,160) 36(-1200,260) 37(-1100,60) 38(-1100,160) 39(-1100,260) 40(-1000,60) 41(-1000,160) 42(-1000,260) 43(-900,60) 44(-900,160) 45(-900,260) 46(-800,60) 47(-800,160) 48(-800,260) 49(-700,60) 50(-700,160) 51(-700,260) 52(-600,60) 53(-600,160) 54(-600,260) 55(-500,60) 56(-500,160) 57(-500,260) 58(-400,60) 59(-400,160) 60(-400,260) 61(-300,60) 62(-300,160) 63(-300,260) 64(-200,60) 65(-200,160) 66(-200,260) 67(-100,60) 68(-100,160) 69(-100,260) 70(0,60) 71(0,160) 72(0,260) 73(100,60) 74(100,160) 75(100,260) 76(200,60) 77(200,160) 78(200,260) 79(300,60) 80(300,160) 81(300,260) 82(400,60) 83(400,160) 84(400,260) 85(500,60) 86(500,160) 87(500,260) 88(600,60) 89(600,160) 90(600,260) 91(700,60) 92(700,160) 93(700,260) 94(800,60) 95(800,160) 96(800,260) 97(900,60) 98(900,160) 99(900,260) 100(1000,60) 101(1000,160) 102(1000,260) 103(1100,60) 104(1100,160) 105(1100,260) 106(1200,60) 107(1200,160) 108(1200,260) 109(1300,60) 110(1300,160) 111(1300,260) 112(1400,60) 113(1400,160) 114(1400,260) 115(1500,60) 116(1500,160) 117(1500,260) 118(1600,60) 119(1600,160) 120(1600,260) 121(1700,60) 122(1700,160) 123(1700,260) 124(1800,60) 125(1800,160) 126(1800,260) 127(1900,60) 128(1900,160) 129(1900,260) 130(2000,60) 131(2000,160) 132(2000,260) 133(2100,60) 134(2100,160) 135(2100,260) 136(2200,60) 137(2200,160) 138(2200,260) 139(2300,60) 140(2300,160) 141(2300,260)
Top Overlay:
  lines w8: -2355.08,-330.55 2355.08,-330.55 2355.08,-4.17 -2355.08,-4.17 -2355.08,-330.55
  text "1" at -2323.43,-301.18 h56.1
  text "3" at -2326.38,-86.61 h56.1
Mechanical 16:
  rectangle: -2310,0 -2290,270
  rectangle: -2210,0 -2190,270
  rectangle: -2110,0 -2090,270
  rectangle: -2010,0 -1990,270
  rectangle: -1910,0 -1890,270
  rectangle: -1810,0 -1790,270
  rectangle: -1710,0 -1690,270
  rectangle: -1610,0 -1590,270
  rectangle: -1510,0 -1490,270
  rectangle: -1410,0 -1390,270
  rectangle: -1310,0 -1290,270
  rectangle: -1210,0 -1190,270
  rectangle: -1110,0 -1090,270
  rectangle: -1010,0 -990,270
  rectangle: -910,0 -890,270
  rectangle: -810,0 -790,270
  rectangle: -710,0 -690,270
  rectangle: -610,0 -590,270
  rectangle: -510,0 -490,270
  rectangle: -410,0 -390,270
  rectangle: -310,0 -290,270
  rectangle: -210,0 -190,270
  rectangle: -110,0 -90,270
  rectangle: -10,0 10,270
  rectangle: 90,0 110,270
  rectangle: 190,0 210,270
  rectangle: 290,0 310,270
  rectangle: 390,0 410,270
  rectangle: 490,0 510,270
  rectangle: 590,0 610,270
  rectangle: 690,0 710,270
  rectangle: 790,0 810,270
  rectangle: 890,0 910,270
  rectangle: 990,0 1010,270
  rectangle: 1090,0 1110,270
  rectangle: 1190,0 1210,270
  rectangle: 1290,0 1310,270
  rectangle: 1390,0 1410,270
  rectangle: 1490,0 1510,270
  rectangle: 1590,0 1610,270
  rectangle: 1690,0 1710,270
  rectangle: 1790,0 1810,270
  rectangle: 1890,0 1910,270
  rectangle: 1990,0 2010,270
  rectangle: 2090,0 2110,270
  rectangle: 2190,0 2210,270
  rectangle: 2290,0 2310,270

## SSW-148-02-S-D [mm]
pads (96):
  oct 1.5x1.5 hole 1: 1(-59.69,-1.27) 2(-59.69,1.27) 3(-57.15,-1.27) 4(-57.15,1.27) 5(-54.61,-1.27) 6(-54.61,1.27) 7(-52.07,-1.27) 8(-52.07,1.27) 9(-49.53,-1.27) 10(-49.53,1.27) 11(-46.99,-1.27) 12(-46.99,1.27) 13(-44.45,-1.27) 14(-44.45,1.27) 15(-41.91,-1.27) 16(-41.91,1.27) 17(-39.37,-1.27) 18(-39.37,1.27) 19(-36.83,-1.27) 20(-36.83,1.27) 21(-34.29,-1.27) 22(-34.29,1.27) 23(-31.75,-1.27) 24(-31.75,1.27) 25(-29.21,-1.27) 26(-29.21,1.27) 27(-26.67,-1.27) 28(-26.67,1.27) 29(-24.13,-1.27) 30(-24.13,1.27) 31(-21.59,-1.27) 32(-21.59,1.27) 33(-19.05,-1.27) 34(-19.05,1.27) 35(-16.51,-1.27) 36(-16.51,1.27) 37(-13.97,-1.27) 38(-13.97,1.27) 39(-11.43,-1.27) 40(-11.43,1.27) 41(-8.89,-1.27) 42(-8.89,1.27) 43(-6.35,-1.27) 44(-6.35,1.27) 45(-3.81,-1.27) 46(-3.81,1.27) 47(-1.27,-1.27) 48(-1.27,1.27) 49(1.27,-1.27) 50(1.27,1.27) 51(3.81,-1.27) 52(3.81,1.27) 53(6.35,-1.27) 54(6.35,1.27) 55(8.89,-1.27) 56(8.89,1.27) 57(11.43,-1.27) 58(11.43,1.27) 59(13.97,-1.27) 60(13.97,1.27) 61(16.51,-1.27) 62(16.51,1.27) 63(19.05,-1.27) 64(19.05,1.27) 65(21.59,-1.27) 66(21.59,1.27) 67(24.13,-1.27) 68(24.13,1.27) 69(26.67,-1.27) 70(26.67,1.27) 71(29.21,-1.27) 72(29.21,1.27) 73(31.75,-1.27) 74(31.75,1.27) 75(34.29,-1.27) 76(34.29,1.27) 77(36.83,-1.27) 78(36.83,1.27) 79(39.37,-1.27) 80(39.37,1.27) 81(41.91,-1.27) 82(41.91,1.27) 83(44.45,-1.27) 84(44.45,1.27) 85(46.99,-1.27) 86(46.99,1.27) 87(49.53,-1.27) 88(49.53,1.27) 89(52.07,-1.27) 90(52.07,1.27) 91(54.61,-1.27) 92(54.61,1.27) 93(57.15,-1.27) 94(57.15,1.27) 95(59.69,-1.27) 96(59.69,1.27)
Top Overlay:
  lines w0.203: -61.089,-2.425 61.089,-2.425 61.089,2.425 -61.089,2.425 -61.089,-2.425
  text "1" at -60.198,-4.318 h1.42
  text "2" at -60.198,2.794 h1.42
Mechanical 16:
  drawing of 384 lines, arcs and shapes, not listed

## SSW-148-02-S-D-RA [mil]
pads (96):
  oct 59.06x59.06 hole 39.37: 1(-2350,60) 2(-2350,160) 3(-2250,60) 4(-2250,160) 5(-2150,60) 6(-2150,160) 7(-2050,60) 8(-2050,160) 9(-1950,60) 10(-1950,160) 11(-1850,60) 12(-1850,160) 13(-1750,60) 14(-1750,160) 15(-1650,60) 16(-1650,160) 17(-1550,60) 18(-1550,160) 19(-1450,60) 20(-1450,160) 21(-1350,60) 22(-1350,160) 23(-1250,60) 24(-1250,160) 25(-1150,60) 26(-1150,160) 27(-1050,60) 28(-1050,160) 29(-950,60) 30(-950,160) 31(-850,60) 32(-850,160) 33(-750,60) 34(-750,160) 35(-650,60) 36(-650,160) 37(-550,60) 38(-550,160) 39(-450,60) 40(-450,160) 41(-350,60) 42(-350,160) 43(-250,60) 44(-250,160) 45(-150,60) 46(-150,160) 47(-50,60) 48(-50,160) 49(50,60) 50(50,160) 51(150,60) 52(150,160) 53(250,60) 54(250,160) 55(350,60) 56(350,160) 57(450,60) 58(450,160) 59(550,60) 60(550,160) 61(650,60) 62(650,160) 63(750,60) 64(750,160) 65(850,60) 66(850,160) 67(950,60) 68(950,160) 69(1050,60) 70(1050,160) 71(1150,60) 72(1150,160) 73(1250,60) 74(1250,160) 75(1350,60) 76(1350,160) 77(1450,60) 78(1450,160) 79(1550,60) 80(1550,160) 81(1650,60) 82(1650,160) 83(1750,60) 84(1750,160) 85(1850,60) 86(1850,160) 87(1950,60) 88(1950,160) 89(2050,60) 90(2050,160) 91(2150,60) 92(2150,160) 93(2250,60) 94(2250,160) 95(2350,60) 96(2350,160)
Top Overlay:
  lines w8: -2405.08,-330.55 2405.08,-330.55 2405.08,-4.17 -2405.08,-4.17 -2405.08,-330.55
  text "1" at -2373.43,-301.18 h56.1
  text "2" at -2376.38,-86.61 h56.1
Mechanical 16:
  rectangle: -2360,0 -2340,170
  rectangle: -2260,0 -2240,170
  rectangle: -2160,0 -2140,170
  rectangle: -2060,0 -2040,170
  rectangle: -1960,0 -1940,170
  rectangle: -1860,0 -1840,170
  rectangle: -1760,0 -1740,170
  rectangle: -1660,0 -1640,170
  rectangle: -1560,0 -1540,170
  rectangle: -1460,0 -1440,170
  rectangle: -1360,0 -1340,170
  rectangle: -1260,0 -1240,170
  rectangle: -1160,0 -1140,170
  rectangle: -1060,0 -1040,170
  rectangle: -960,0 -940,170
  rectangle: -860,0 -840,170
  rectangle: -760,0 -740,170
  rectangle: -660,0 -640,170
  rectangle: -560,0 -540,170
  rectangle: -460,0 -440,170
  rectangle: -360,0 -340,170
  rectangle: -260,0 -240,170
  rectangle: -160,0 -140,170
  rectangle: -60,0 -40,170
  rectangle: 40,0 60,170
  rectangle: 140,0 160,170
  rectangle: 240,0 260,170
  rectangle: 340,0 360,170
  rectangle: 440,0 460,170
  rectangle: 540,0 560,170
  rectangle: 640,0 660,170
  rectangle: 740,0 760,170
  rectangle: 840,0 860,170
  rectangle: 940,0 960,170
  rectangle: 1040,0 1060,170
  rectangle: 1140,0 1160,170
  rectangle: 1240,0 1260,170
  rectangle: 1340,0 1360,170
  rectangle: 1440,0 1460,170
  rectangle: 1540,0 1560,170
  rectangle: 1640,0 1660,170
  rectangle: 1740,0 1760,170
  rectangle: 1840,0 1860,170
  rectangle: 1940,0 1960,170
  rectangle: 2040,0 2060,170
  rectangle: 2140,0 2160,170
  rectangle: 2240,0 2260,170
  rectangle: 2340,0 2360,170

## SSW-148-02-S-Q [mm]
pads (96):
  oct 1.5x1.5 hole 1: 1(-59.69,-2.54) 2(-59.69,2.54) 3(-57.15,-2.54) 4(-57.15,2.54) 5(-54.61,-2.54) 6(-54.61,2.54) 7(-52.07,-2.54) 8(-52.07,2.54) 9(-49.53,-2.54) 10(-49.53,2.54) 11(-46.99,-2.54) 12(-46.99,2.54) 13(-44.45,-2.54) 14(-44.45,2.54) 15(-41.91,-2.54) 16(-41.91,2.54) 17(-39.37,-2.54) 18(-39.37,2.54) 19(-36.83,-2.54) 20(-36.83,2.54) 21(-34.29,-2.54) 22(-34.29,2.54) 23(-31.75,-2.54) 24(-31.75,2.54) 25(-29.21,-2.54) 26(-29.21,2.54) 27(-26.67,-2.54) 28(-26.67,2.54) 29(-24.13,-2.54) 30(-24.13,2.54) 31(-21.59,-2.54) 32(-21.59,2.54) 33(-19.05,-2.54) 34(-19.05,2.54) 35(-16.51,-2.54) 36(-16.51,2.54) 37(-13.97,-2.54) 38(-13.97,2.54) 39(-11.43,-2.54) 40(-11.43,2.54) 41(-8.89,-2.54) 42(-8.89,2.54) 43(-6.35,-2.54) 44(-6.35,2.54) 45(-3.81,-2.54) 46(-3.81,2.54) 47(-1.27,-2.54) 48(-1.27,2.54) 49(1.27,-2.54) 50(1.27,2.54) 51(3.81,-2.54) 52(3.81,2.54) 53(6.35,-2.54) 54(6.35,2.54) 55(8.89,-2.54) 56(8.89,2.54) 57(11.43,-2.54) 58(11.43,2.54) 59(13.97,-2.54) 60(13.97,2.54) 61(16.51,-2.54) 62(16.51,2.54) 63(19.05,-2.54) 64(19.05,2.54) 65(21.59,-2.54) 66(21.59,2.54) 67(24.13,-2.54) 68(24.13,2.54) 69(26.67,-2.54) 70(26.67,2.54) 71(29.21,-2.54) 72(29.21,2.54) 73(31.75,-2.54) 74(31.75,2.54) 75(34.29,-2.54) 76(34.29,2.54) 77(36.83,-2.54) 78(36.83,2.54) 79(39.37,-2.54) 80(39.37,2.54) 81(41.91,-2.54) 82(41.91,2.54) 83(44.45,-2.54) 84(44.45,2.54) 85(46.99,-2.54) 86(46.99,2.54) 87(49.53,-2.54) 88(49.53,2.54) 89(52.07,-2.54) 90(52.07,2.54) 91(54.61,-2.54) 92(54.61,2.54) 93(57.15,-2.54) 94(57.15,2.54) 95(59.69,-2.54) 96(59.69,2.54)
Top Overlay:
  lines w0.203: -61.089,-3.695 61.089,-3.695 61.089,3.695 -61.089,3.695 -61.089,-3.695
  text "1" at -60.198,-5.588 h1.42
  text "2" at -60.198,4.064 h1.42
Mechanical 16:
  drawing of 384 lines, arcs and shapes, not listed